# Altium footprint library 13-IC Packages-1bga.PcbLib: 97 footprints (part 14 of 14) (continued)
## FRES-MAPBGA-256 [mm] (continued)
  round 0.5 smd: T16(7.5,-7.5)
Top Overlay:
  circle w0.25: c-9.15,8.35 r0.125
  region: -7.5,8.5 -8.5,7.5 -8.5,8.5
  lines w0.2: -8.5,7.5 -7.5,8.5 ; -8.5,-8.5 8.5,-8.5 8.5,8.5 -8.5,8.5 -8.5,-8.5
Mechanical 13:
  lines w0.1: -8.5,-8.5 8.5,-8.5 8.5,8.5 -8.5,8.5 -8.5,-8.5
Mechanical 15:
  lines w0.05: -8.75,-8.75 8.75,-8.75 8.75,8.75 -8.75,8.75 -8.75,-8.75
  lines w0.1: -0.5,0 0.5,0 ; 0,-0.5 0,0.5

## K5D1G12ACC [mil]
height 157.48
pads (111):
  round 17 smd: A2(-204.72,-110.24) A9(-204.72,110.24) A10(-204.72,141.73) B1(-173.23,-141.73) B2(-173.23,-110.24) B3(-173.23,-78.74) B4(-173.23,-47.24) B5(-173.23,-15.74) B6(-173.23,15.75) B7(-173.23,47.24) B8(-173.23,78.74) B9(-173.23,110.24) B10(-173.23,141.73) C2(-141.73,-110.23) C3(-141.73,-78.74) C4(-141.73,-47.24) C5(-141.73,-15.75) C6(-141.73,15.75) C7(-141.73,47.24) C8(-141.73,78.74) C9(-141.73,110.24) D2(-110.24,-110.24) D3(-110.24,-78.74) D4(-110.24,-47.24) D5(-110.24,-15.75) D6(-110.24,15.75) D7(-110.24,47.24) D8(-110.24,78.74) D9(-110.24,110.24) E2(-78.74,-110.23) E3(-78.74,-78.74) E4(-78.74,-47.24) E5(-78.74,-15.75) E6(-78.74,15.75) E7(-78.74,47.24) E8(-78.74,78.74) E9(-78.74,110.24) F2(-47.24,-110.24) F3(-47.24,-78.74) F4(-47.24,-47.24) F5(-47.24,-15.75) F6(-47.24,15.75) F7(-47.24,47.24) F8(-47.24,78.74) F9(-47.24,110.24) G2(-15.75,-110.23) G3(-15.75,-78.74) G4(-15.75,-47.24) G5(-15.75,-15.75) G6(-15.75,15.75) G7(-15.75,47.24) G8(-15.75,78.74) G9(-15.75,110.24) H3(15.75,-78.74) H4(15.75,-47.24) H5(15.75,-15.75) H6(15.75,15.75) H7(15.75,47.24) H8(15.75,78.74) H9(15.75,110.24) J2(15.75,-110.24) J3(47.24,-78.74) J4(47.24,-47.24) J5(47.24,-15.75) J6(47.24,15.75) J7(47.24,47.24) J8(47.24,78.74) J9(47.24,110.24) K2(47.24,-110.23) K2(78.74,-110.24) K3(78.74,-78.74) K4(78.74,-47.24) K5(78.74,-15.75) K6(78.74,15.75) K7(78.74,47.24) K8(78.74,78.74) K9(78.74,110.24) L2(110.24,-110.23) L3(110.24,-78.74) L4(110.24,-47.24) L5(110.24,-15.75) L6(110.24,15.75) L7(110.24,47.24) L8(110.24,78.74) L9(110.24,110.24) M2(141.73,-110.24) M3(141.73,-78.74) M4(141.73,-47.24) M5(141.73,-15.75) M6(141.73,15.75) M7(141.73,47.24) M8(141.73,78.74) M9(141.73,110.24) N1(173.23,-141.73) N2(173.23,-110.24) N3(173.23,-78.74) N4(173.23,-47.24) N5(173.23,-15.74) N6(173.23,15.75) N7(173.23,47.24) N8(173.23,78.74) N9(173.23,110.24) N10(173.23,141.73) P1(204.72,-141.73) P2(204.72,-110.24) P9(204.72,110.24) P10(204.72,141.73)
  rect 7x38.5 smd: ""(-261.42,-196.46) ""(261.02,196.06)
  rect 38.5x7 smd: ""(-242.91,-212.2) ""(242.52,211.81)
Top Overlay:
  circle w1: c-202.55,-164.17 r12
  lines w1: -255.91,-206.69 -255.91,206.69 255.91,206.69 255.91,-206.69 -255.91,-206.69

## K5D1258DCM [mil]
height 157.48
pads (137):
  round 15 smd mask+2: A2(-220.47,-110.24) A9(-220.47,110.24) A10(-220.47,141.73) B1(-188.98,-141.73) B2(-188.98,-110.24) B3(-188.98,-78.74) B4(-188.98,-47.24) B5(-188.98,-15.75) B6(-188.98,15.75) B7(-188.98,47.24) B8(-188.98,78.74) B10(-188.98,141.73) C2(-157.48,-110.24) C3(-157.48,-78.74) C4(-157.48,-47.24) C6(-157.48,15.75) C7(-157.48,47.24) C8(-157.48,78.74) C9(-157.48,110.24) D1(-125.98,-141.73) D2(-125.98,-110.24) D3(-125.98,-78.74) D4(-125.98,-47.24) D5(-125.98,-15.75) D6(-125.98,15.75) D7(-125.98,47.24) D8(-125.98,78.74) D10(-125.98,141.73) E1(-94.49,-141.73) E2(-94.49,-110.24) E3(-94.49,-78.74) E4(-94.49,-47.24) E5(-94.49,-15.75) E6(-94.49,15.75) E7(-94.49,47.24) E8(-94.49,78.74) E9(-94.49,110.24) F1(-62.99,-141.73) F2(-62.99,-110.24) F3(-62.99,-78.74) F4(-62.99,-47.24) F5(-62.99,-15.75) F6(-62.99,15.75) F7(-62.99,47.24) F8(-62.99,78.74) F10(-62.99,141.73) G1(-31.5,-141.73) G2(-31.5,-110.24) G3(-31.5,-78.74) G4(-31.5,-47.24) G5(-31.5,-15.75) G6(-31.5,15.75) G7(-31.5,47.24) G8(-31.5,78.74) G9(-31.5,110.24) H1(0,-141.73) H2(0,-110.24) H3(0,-78.74) H4(0,-47.24) H5(0,-15.75) H6(0,15.75) H7(0,47.24) H8(0,78.74) H10(0,141.73) J2(31.5,-110.24) J3(31.5,-78.74) J4(31.5,-47.24) J5(31.5,-15.75) J6(31.5,15.75) J7(31.5,47.24) J8(31.5,78.74) J10(31.5,141.73) K1(62.99,-141.73) K2(62.99,-110.24) K3(62.99,-78.74) K4(62.99,-47.24) K5(62.99,-15.75) K6(62.99,15.75) K7(62.99,47.24) K8(62.99,78.74) K9(62.99,110.24) L1(94.49,-141.73) L2(94.49,-110.24) L3(94.49,-78.74) L4(94.49,-47.24) L5(94.49,-15.75) L6(94.49,15.75) L7(94.49,47.24) L8(94.49,78.74) L9(94.49,110.24) M1(125.98,-141.73) M3(125.98,-78.74) M4(125.98,-47.24) M5(125.98,-15.75) M6(125.98,15.75) M7(125.98,47.24) M8(125.98,78.74) M10(125.98,141.73) N1(157.48,-141.73) N2(157.48,-110.24) N3(157.48,-78.74) N4(157.48,-47.24) N5(157.48,-15.75) N6(157.48,15.75) N7(157.48,47.24) N8(157.48,78.74) N9(157.48,110.24) P1(188.98,-141.73) P2(188.98,-110.24) P3(188.98,-78.74) P4(188.98,-47.24) P5(188.98,-15.75) P7(188.98,47.24) P8(188.98,78.74) P10(188.98,141.73) R1(220.47,-141.73) R2(220.47,-110.24) R9(220.47,110.24) R10(220.47,141.73)
  round 15 smd mask+0: B9(-188.98,110.24) C1(-157.48,-141.73) C5(-157.48,-15.75) C10(-157.48,141.73) D9(-125.98,110.24) E10(-94.49,141.73) F9(-62.99,110.24) G10(-31.5,141.73) H9(0,110.24) J1(31.5,-141.73) J9(31.5,110.24) K10(62.99,141.73) L10(94.49,141.73) M2(125.98,-110.24) M9(125.98,110.24) N10(157.48,141.73) P6(188.98,15.75) P9(188.98,110.24)
Top Overlay:
  circle w1: c-216,-169.5 r12
  lines w1: -256.23,-206.69 256.22,-206.69 ; -256.23,-206.69 -256.23,206.69 ; -256.23,-206.69 -275.59,-206.69 -275.59,206.69 -256.23,206.69 ; -256.23,206.69 256.22,206.69 ; 256.22,-206.69 256.22,206.69 ; 256.22,-206.69 275.58,-206.69 ; 256.22,206.69 275.58,206.69 275.59,-206.68 ; 275.58,-206.69 275.59,-206.68
3D body "k5d1258dcm.stp": height 26.77, standoff 0, extent -255.91,-208.66 255.91,204.72

## K9F1208 [mil]
height 157.48
pads (63):
  round 18 smd mask+2: A1(-110.24,-78.74) A2(-110.24,-47.24) A3(-110.24,-15.75) A4(-110.24,15.75) A5(-110.24,47.24) A6(-110.24,79.27) B1(-78.74,-78.74) B2(-78.74,-47.24) B3(-78.74,-15.75) B4(-78.74,15.75) B5(-78.74,47.24) B6(-78.74,79.27) C1(-47.24,-78.74) C2(-47.24,-47.24) C3(-47.24,-15.75) C4(-47.24,15.75) C5(-47.24,47.24) C6(-47.24,79.27) D1(-15.75,-78.74) D2(-15.75,-47.24) D3(-15.75,-15.75) D4(-15.75,15.75) D5(-15.75,47.24) D6(-15.75,79.27) E1(15.75,-78.74) E2(15.75,-47.24) E3(15.75,-15.75) E4(15.75,15.75) E5(15.75,47.24) E6(15.75,80.27) F1(47.24,-78.74) F2(47.24,-47.24) F3(47.24,-15.75) F4(47.24,15.75) F5(47.24,47.24) F6(47.24,80.27) G1(78.74,-78.74) G2(78.74,-47.24) G3(78.74,-15.75) G4(78.74,15.75) G5(78.74,47.24) G6(78.74,80.27) H1(110.24,-78.74) H2(110.24,-47.24) H3(110.24,-15.75) H4(110.24,15.75) H5(110.24,47.24) H6(110.24,80.27) ""(-173.23,-141.73) ""(-173.23,-110.24) ""(-173.23,110.24) ""(-173.23,141.73) ""(-141.73,-141.73) ""(-141.73,110.24) ""(-141.73,141.73) ""(141.73,-141.73) ""(141.73,-110.24) ""(141.73,110.24) ""(141.73,141.73) ""(173.23,-141.73) ""(173.23,-110.24) ""(173.23,110.24) ""(173.23,141.73)
Top Overlay:
  circle w1: c-157.5,-125.5 r13.2
  lines w1: -256,-167.32 -256,167.32 -216.81,167.32 217.05,167.32 256,167.32 256,-167.32 217.05,-167.32 -216.81,-167.32 -256,-167.32 ; -216.81,-177.17 -216.81,177.17 217.05,177.17 217.05,-177.17 -216.81,-177.17
Top Solder:
  region: 257,-138.32 257,-168.32 227,-168.32 227,-173.32 262,-173.32 262,-138.32
  region: 218.05,-148.17 218.05,-178.17 188.05,-178.17 188.05,-183.17 223.05,-183.17 223.05,-148.17
  region: 227,168.32 257,168.32 257,138.32 262,138.32 262,173.32 227,173.32
  region: 188.05,178.17 218.05,178.17 218.05,148.17 223.05,148.17 223.05,183.17 188.05,183.17
  region: -257,138.32 -257,168.32 -227,168.32 -227,173.32 -262,173.32 -262,138.32
  region: -217.81,148.17 -217.81,178.17 -187.81,178.17 -187.81,183.17 -222.81,183.17 -222.81,148.17
  region: -227,-168.32 -257,-168.32 -257,-138.32 -262,-138.32 -262,-173.32 -227,-173.32
  region: -187.81,-178.17 -217.81,-178.17 -217.81,-148.17 -222.81,-148.17 -222.81,-183.17 -187.81,-183.17

## K9F5608 [mil]
height 157.48
pads (63):
  round 18 smd mask+2: A1(-110.24,-78.74) A2(-110.24,-47.24) A3(-110.24,-15.75) A4(-110.24,15.75) A5(-110.24,47.24) A6(-110.24,79.27) B1(-78.74,-78.74) B2(-78.74,-47.24) B3(-78.74,-15.75) B4(-78.74,15.75) B5(-78.74,47.24) B6(-78.74,79.27) C1(-47.24,-78.74) C2(-47.24,-47.24) C3(-47.24,-15.75) C4(-47.24,15.75) C5(-47.24,47.24) C6(-47.24,79.27) D1(-15.75,-78.74) D2(-15.75,-47.24) D3(-15.75,-15.75) D4(-15.75,15.75) D5(-15.75,47.24) D6(-15.75,79.27) E1(15.75,-78.74) E2(15.75,-47.24) E3(15.75,-15.75) E4(15.75,15.75) E5(15.75,47.24) E6(15.75,80.27) F1(47.24,-78.74) F2(47.24,-47.24) F3(47.24,-15.75) F4(47.24,15.75) F5(47.24,47.24) F6(47.24,80.27) G1(78.74,-78.74) G2(78.74,-47.24) G3(78.74,-15.75) G4(78.74,15.75) G5(78.74,47.24) G6(78.74,80.27) H1(110.24,-78.74) H2(110.24,-47.24) H3(110.24,-15.75) H4(110.24,15.75) H5(110.24,47.24) H6(110.24,80.27) ""(-173.23,-141.73) ""(-173.23,-110.24) ""(-173.23,110.24) ""(-173.23,141.73) ""(-141.73,-141.73) ""(-141.73,110.24) ""(-141.73,141.73) ""(141.73,-141.73) ""(141.73,-110.24) ""(141.73,110.24) ""(141.73,141.73) ""(173.23,-141.73) ""(173.23,-110.24) ""(173.23,110.24) ""(173.23,141.73)
Top Overlay:
  circle w1: c-157.5,-125.5 r13.2
  lines w1: -216.81,-177.17 -216.81,177.17 217.05,177.17 217.05,-177.17 -216.81,-177.17
Top Solder:
  region: 218.05,-148.17 218.05,-178.17 188.05,-178.17 188.05,-183.17 223.05,-183.17 223.05,-148.17
  region: 188.05,178.17 218.05,178.17 218.05,148.17 223.05,148.17 223.05,183.17 188.05,183.17
  region: -217.81,148.17 -217.81,178.17 -187.81,178.17 -187.81,183.17 -222.81,183.17 -222.81,148.17
  region: -187.81,-178.17 -217.81,-178.17 -217.81,-148.17 -222.81,-148.17 -222.81,-183.17 -187.81,-183.17

## LTM8033 [mm]
height 1.6
pads (76):
  round 0.635 smd mask+0.07: A1/out(-6.35,-4.445)
  rect 0.635x0.635 smd mask+0.07: A2/out(-6.35,-3.175) A3/out(-6.35,-1.905) A4/gnd(-6.35,-0.635) A5/gnd(-6.35,0.635) A6/share(-6.35,1.905) A7/adj(-6.35,3.175) A8/gnd(-6.35,4.445) B1/out(-5.08,-4.445) B2/out(-5.08,-3.175) B3/out(-5.08,-1.905) B4/gnd(-5.08,-0.635) B5/gnd(-5.08,0.635) B6/rt(-5.08,1.905) B7/pgood(-5.08,3.175) B8/sync(-5.08,4.445) C1/out(-3.81,-4.445) C2/out(-3.81,-3.175) C3/out(-3.81,-1.905) C4/gnd(-3.81,-0.635) C5/gnd(-3.81,0.635) C6/gnd(-3.81,1.905) C7/gnd(-3.81,3.175) C8/gnd(-3.81,4.445) D1/out(-2.54,-4.445) D2/out(-2.54,-3.175) D3/out(-2.54,-1.905) D4/gnd(-2.54,-0.635) D5/gnd(-2.54,0.635) D6/gnd(-2.54,1.905) D7/gnd(-2.54,3.175) D8/gnd(-2.54,4.445) E1/gnd(-1.27,-4.445) E2/gnd(-1.27,-3.175) E3/gnd(-1.27,-1.905) E4/gnd(-1.27,-0.635) E5/gnd(-1.27,0.635) E6/gnd(-1.27,1.905) E7/gnd(-1.27,3.175) E8/gnd(-1.27,4.445) F1/gnd(0,-4.445) F2/gnd(0,-3.175) F3/gnd(0,-1.905) F4/gnd(0,-0.635) F5/gnd(0,0.635) F6/gnd(0,1.905) F6/gnd(0,3.175) F8/gnd(0,4.445) G1/gnd(1.27,-4.445) G2/gnd(1.27,-3.175) G3/aux(1.27,-1.905) G4/bias(1.27,-0.635) G5/gnd(1.27,0.635) G6/gnd(1.27,1.905) G7/gnd(1.27,3.175) G8/run(1.27,4.445) H5/gnd(2.54,0.635) H6/gnd(2.54,1.905) J1/in(3.81,-4.445) J2/in(3.81,-3.175) J3/in(3.81,-1.905) J5/gnd(3.81,0.635) J6/gnd(3.81,1.905) J8/fin(3.81,4.445) K1/in(5.08,-4.445) K2/in(5.08,-3.175) K3/in(5.08,-1.905) K5/gnd(5.08,0.635) K6/gnd(5.08,1.905) K8/fin(5.08,4.445) L2/in(6.35,-3.175) L3/in(6.35,-1.905) L5/gnd(6.35,0.635) L6/gnd(6.35,1.905) L8/fin(6.35,4.445)
  rect 0.635x0.635 smd: L1/in(6.35,-4.445)
Top Overlay:
  lines w0.254: -7.645,-5.766 7.645,-5.766 7.645,5.766 -7.645,5.766 -7.645,-5.766
Mechanical 15:
  lines w0.1: -7.5,-5.625 -7.5,5.625 7.5,5.625 7.5,-5.625 -7.5,-5.625
3D body "ltm8033.stp": height 4.93, standoff 0, extent -7.5,-5.625 7.5,5.625

## LTM-2881 [mm]
height 1.6
pads (32):
  round 0.65 smd mask+0.07: "A1 / Dout"(-6.35,-4.445) "A2 / TE"(-6.35,-3.175) "A3 / DI"(-6.35,-1.905) "A4 / DE"(-6.35,-0.635) "A5 / DE-"(-6.35,0.635) "A6 / RO"(-6.35,1.905) "A7 / VL"(-6.35,3.175) B1(-5.08,-4.445) B2(-5.08,-3.175) B3(-5.08,-1.905) "B4 / GND"(-5.08,-0.635) B5(-5.08,0.635) B6(-5.08,1.905) "B7 / Vcc"(-5.08,3.175) B8(-5.08,4.445) K1(5.08,-4.445) K2(5.08,-3.175) K3(5.08,-1.905) K4(5.08,-0.635) "K5 / GND2"(5.08,0.635) K6(5.08,1.905) K7(5.08,3.175) K8(5.08,4.445) "L1 / Din"(6.35,-4.445) "L2 / SLO-"(6.35,-3.175) "L3 / Y"(6.35,-1.905) "L4 / Z"(6.35,-0.635) "L5 / B"(6.35,0.635) "L6 / A"(6.35,1.905) "L7 / Vcc2"(6.35,3.175) L8(6.35,4.445)
  round 0.65 smd: "A8 / ON"(-6.35,4.445)
Top Overlay:
  lines w0.1: -0.318,0 0.318,0 ; 0,-0.318 0,0.318
  lines w0.254: -7.48,-4.966 -6.782,-5.664 ; -7.5,-5.675 7.5,-5.675 7.5,5.675 -7.5,5.675 -7.5,-5.675
3D body "ltm2881.stp": height 3.65, standoff -0.03, extent -7.5,-5.75 7.5,5.75

## MTGP720H320V6P [mm]
pads (1):
  round 7.2 hole 3.25: 1(0,0)
via -2.2,-1.35 diameter 1 hole 0.5
via -2.2,1.375 diameter 1 hole 0.5
via 0,2.525 diameter 1 hole 0.5
via 2.2,1.35 diameter 1 hole 0.5
via 0,-2.625 diameter 1 hole 0.5
via 2.2,-1.35 diameter 1 hole 0.5
Mechanical 8:
  circle w0.1: c0,0 r2.6
  circle w0.1: c0,0 r3.75
  lines w0.1: -2.657,1.625 -2.224,1.375 ; -2.632,-1.6 -2.199,-1.35 ; -2.474,0.942 -2.224,1.375 ; -2.449,-0.917 -2.199,-1.35 ; -1.974,1.808 -2.224,1.375 ; -1.949,-1.783 -2.199,-1.35 ; -1.791,1.125 -2.224,1.375 ; -1.766,-1.1 -2.199,-1.35 ; -0.5,-2.625 0,-2.625 ; -0.5,0 0,0 ; -0.5,2.525 0,2.525 ; 0,-3.125 0,-2.625 ; 0,-2.125 0,-2.625 ; 0,-0.5 0,0 ; 0,0.5 0,0 ; 0,2.025 0,2.525 ; 0,3.025 0,2.525 ; 0.5,-2.625 0,-2.625 ; 0.5,0 0,0 ; 0.5,2.525 0,2.525 ; 1.766,-1.1 2.199,-1.35 ; 1.766,1.1 2.199,1.35 ; 1.949,-1.783 2.199,-1.35 ; 1.949,1.783 2.199,1.35 ; 2.449,-0.917 2.199,-1.35 ; 2.449,0.917 2.199,1.35 ; 2.632,-1.6 2.199,-1.35 ; 2.632,1.6 2.199,1.35
Mechanical 14:
  circle w0.1: c0,0 r3.75
Mechanical 15:
  circle w0.05: c0,0 r3.85
3D body "mtgp720h320v6p.stp": height 0.1, standoff -1.75, extent -3.627,-3.627 3.628,3.628

## NAND99R4M2AZBA5 [mil]
height 62.99
pads (153):
  round 16.5 smd: A1(236.22,173.23) A2(236.22,141.73) A10(236.22,-110.24) A11(236.22,-141.73) A12(236.22,-173.23) B1(204.72,173.23) B2(204.72,141.73) B3(204.72,110.5) B10(204.72,-110.24) B11(204.72,-141.73) B12(204.72,-173.23) C1(173.23,173.23) C2(173.23,141.73) C3(173.23,110.24) C4(173.23,78.74) C5(173.23,47.24) C6(173.23,15.75) C7(173.23,-15.75) C8(173.23,-47.24) C9(173.23,-78.74) C10(173.23,-110.24) C11(173.23,-141.73) C12(173.23,-173.23) D1(139.73,173.23) D2(140.73,141.73) D3(141.73,110.24) D4(141.73,78.74) D5(141.73,47.24) D6(141.73,15.75) D7(141.73,-15.75) D8(141.73,-47.24) D9(141.73,-78.74) D10(141.73,-110.24) D11(141.73,-141.73) E2(109.24,141.73) E3(110.24,110.24) E4(110.24,78.74) E5(110.24,47.24) E6(110.24,15.75) E7(110.24,-15.75) E8(110.24,-47.24) E9(110.24,-78.74) E10(110.24,-110.24) E11(110.24,-141.73) F2(77.74,141.73) F3(78.74,110.24) F4(78.74,78.74) F5(78.74,47.24) F6(78.74,15.75) F7(78.74,-15.75) F8(78.74,-47.24) F9(78.74,-78.74) F10(78.74,-110.24) F11(78.74,-141.73) G2(46.24,141.73) G3(47.24,110.24) G4(47.24,78.74) G5(47.24,47.24) G6(47.24,15.75) G7(47.24,-15.75) G8(47.24,-47.24) G9(47.24,-78.74) G10(47.24,-110.24) G11(47.24,-141.73) H2(14.75,141.73) H3(15.75,110.24) H4(15.75,78.74) H5(15.75,47.24) H6(15.75,15.75) H7(15.75,-15.75) H8(15.75,-47.24) H9(15.75,-78.74) H10(15.75,-110.24) H11(15.75,-141.73) J2(-16.75,141.73) J3(-15.75,110.24) J4(-15.75,78.74) J5(-15.75,47.24) J6(-15.75,15.75) J7(-15.75,-15.75) J8(-15.75,-47.24) J9(-15.75,-78.74) J10(-15.75,-110.24) J11(-15.75,-141.73) K2(-48.24,141.73) K3(-47.24,110.24) K4(-47.24,78.74) K5(-47.24,47.24) K6(-47.24,15.75) K7(-47.24,-15.75) K8(-47.24,-47.24) K9(-47.24,-78.74) K10(-47.24,-110.24) K11(-47.24,-141.73) L2(-79.74,141.73) L3(-78.74,110.24) L4(-78.74,78.74) L5(-78.74,47.24) L6(-78.74,15.75) L7(-78.74,-15.75) L8(-78.74,-47.24) L9(-78.74,-78.74) L10(-78.74,-110.24) L11(-78.74,-141.73) M2(-111.24,141.73) M3(-110.24,110.24) M4(-110.24,78.74) M5(-110.24,47.24) M6(-110.24,15.75) M7(-110.24,-15.75) M8(-110.24,-47.24) M9(-110.24,-78.74) M10(-110.24,-110.24) M11(-110.24,-141.73) N2(-142.73,141.73) N2(236.22,110.24) N3(-141.73,110.24) N4(-141.73,78.74) N5(-141.73,47.24) N6(-141.73,15.75) N7(-141.73,-15.75) N8(-141.73,-47.24) N9(-141.73,-78.74) N10(-141.73,-110.24) N11(-141.73,-141.73) P1(-173.23,173.23) P2(-173.23,141.73) P3(-173.23,110.24) P4(-173.23,78.74) P5(-173.23,47.24) P6(-173.23,15.75) P7(-173.23,-15.75) P8(-173.23,-47.24) P9(-173.23,-78.74) P10(-173.23,-110.24) P11(-173.23,-141.73) P12(-173.23,-173.23) R1(-204.72,173.23) R2(-204.72,141.73) R3(-204.72,110.5) R10(-204.72,-110.24) R11(-204.72,-141.73) R12(-204.72,-173.23) T1(-236.22,173.23) T2(-236.22,141.73) T3(-236.22,110.5) T10(-236.22,-110.24) T11(-236.22,-141.73) T12(-236.22,-173.23)
  rect 7x38.5 smd: ""(-273,-192) ""(273,192)
  rect 38.5x7 smd: ""(-257,-208) ""(257,208)
Top Overlay:
  circle w1: c202.55,164.17 r12
  lines w3: -265,-200 265,-200 265,200 -265,200 -265,-200

## PB [mm]
Top Overlay:
  circle w0.5: c-0.031,0.013 r2.5
  lines w0.5: -1.737,1.719 1.675,-1.693
  text "Pb" at -1.536,-0.948 h3.05
3D body "pb.stp": height 0.02, standoff 0, extent -2.725,-2.725 2.725,2.725

## RT5350F [mm]
height 1.6
pads (196):
  round 0.406 smd mask+0: A1(-5.2,-5.2) A4(-5.2,-2.8) B2(-4.4,-4.4) B4(-4.4,-2.8) C2(-3.6,-4.4) C3(-3.6,-3.6) C4(-3.6,-2.8) C5(-3.6,-2) D2(-2.8,-4.4) D3(-2.8,-3.6) D4(-2.8,-2.8) D5(-2.8,-2) D6(-2.8,-1.2) D7(-2.8,-0.4) D8(-2.8,0.4) D9(-2.8,1.2) E2(-2,-4.4) E4(-2,-2.8) E5(-2,-2) E6(-2,-1.2) E7(-2,-0.4) E8(-2,0.4) E9(-2,1.2) F1(-1.2,-5.2) F2(-1.2,-4.4) F3(-1.2,-3.6) F4(-1.2,-2.8) F6(-1.2,-1.2) F7(-1.2,-0.4) F8(-1.2,0.4) G6(-0.4,-1.2) G7(-0.4,-0.4) G8(-0.4,0.4) H6(0.4,-1.2) H7(0.4,-0.4) H8(0.4,0.4) J6(1.2,-1.2) J7(1.2,-0.4) J8(1.2,0.4) J9(1.2,1.2) K9(2,1.2) K10(2,2) L10(2.8,2) M10(3.6,2) M11(3.6,2.8) M12(3.6,3.6) N10(4.4,2) N13(4.4,4.4) N14(4.4,5.2) P10(5.2,2) P14(5.2,5.2)
  round 0.406 smd: A2(-5.2,-4.4) A3(-5.2,-3.6) A5(-5.2,-2) A6(-5.2,-1.2) A7(-5.2,-0.4) A8(-5.2,0.4) A9(-5.2,1.2) A10(-5.2,2) A11(-5.2,2.8) A12(-5.2,3.6) A13(-5.2,4.4) A14(-5.2,5.2) B1(-4.4,-5.2) B3(-4.4,-3.6) B5(-4.4,-2) B6(-4.4,-1.2) B7(-4.4,-0.4) B8(-4.4,0.4) B9(-4.4,1.2) B10(-4.4,2) B11(-4.4,2.8) B12(-4.4,3.6) B13(-4.4,4.4) B14(-4.4,5.2) C1(-3.6,-5.2) C6(-3.6,-1.2) C7(-3.6,-0.4) C8(-3.6,0.4) C9(-3.6,1.2) C10(-3.6,2) C11(-3.6,2.8) C12(-3.6,3.6) C13(-3.6,4.4) C14(-3.6,5.2) D1(-2.8,-5.2) D10(-2.8,2) D11(-2.8,2.8) D12(-2.8,3.6) D13(-2.8,4.4) D14(-2.8,5.2) E1(-2,-5.2) E3(-2,-3.6) E10(-2,2) E11(-2,2.8) E12(-2,3.6) E13(-2,4.4) E14(-2,5.2) F5(-1.2,-2) F9(-1.2,1.2) F10(-1.2,2) F11(-1.2,2.8) F12(-1.2,3.6) F13(-1.2,4.4) F14(-1.2,5.2) G1(-0.4,-5.2) G2(-0.4,-4.4) G3(-0.4,-3.6) G4(-0.4,-2.8) G5(-0.4,-2) G9(-0.4,1.2) G10(-0.4,2) G11(-0.4,2.8) G12(-0.4,3.6) G13(-0.4,4.4) G14(-0.4,5.2) H1(0.4,-5.2) H2(0.4,-4.4) H3(0.4,-3.6) H4(0.4,-2.8) H5(0.4,-2) H9(0.4,1.2) H10(0.4,2) H11(0.4,2.8) H12(0.4,3.6) H13(0.4,4.4) H14(0.4,5.2) J1(1.2,-5.2) J2(1.2,-4.4) J3(1.2,-3.6) J4(1.2,-2.8) J5(1.2,-2) J10(1.2,2) J11(1.2,2.8) J12(1.2,3.6) J13(1.2,4.4) J14(1.2,5.2) K1(2,-5.2) K2(2,-4.4) K3(2,-3.6) K4(2,-2.8) K5(2,-2) K6(2,-1.2) K7(2,-0.4) K8(2,0.4) K11(2,2.8) K12(2,3.6) K13(2,4.4) K14(2,5.2) L1(2.8,-5.2) L2(2.8,-4.4) L3(2.8,-3.6) L4(2.8,-2.8) L5(2.8,-2) L6(2.8,-1.2) L7(2.8,-0.4) L8(2.8,0.4) L9(2.8,1.2) L11(2.8,2.8) L12(2.8,3.6) L13(2.8,4.4) L14(2.8,5.2) M1(3.6,-5.2) M2(3.6,-4.4) M3(3.6,-3.6) M4(3.6,-2.8) M5(3.6,-2) M6(3.6,-1.2) M7(3.6,-0.4) M8(3.6,0.4) M9(3.6,1.2) M13(3.6,4.4) M14(3.6,5.2) N1(4.4,-5.2) N2(4.4,-4.4) N3(4.4,-3.6) N4(4.4,-2.8) N5(4.4,-2) N6(4.4,-1.2) N7(4.4,-0.4) N8(4.4,0.4) N9(4.4,1.2) N11(4.4,2.8) N12(4.4,3.6) P1(5.2,-5.2) P2(5.2,-4.4) P3(5.2,-3.6) P4(5.2,-2.8) P5(5.2,-2) P6(5.2,-1.2) P7(5.2,-0.4) P8(5.2,0.4) P9(5.2,1.2) P11(5.2,2.8) P12(5.2,3.6) P13(5.2,4.4)
Top Overlay:
  lines w0.254: -6.178,-5.213 -5.187,-6.203 -4.984,-6.203 ; -6.051,-5.556 -5.479,-6.127 -5.708,-6.127 -6.185,-5.65 -6.185,-5.841 -5.822,-6.203 ; -6.198,-6.203 -5.975,-6.203 6.179,-6.203 6.179,6.198 -6.198,6.198 -6.198,-6.203
3D body "rt5350f.stp": height 1.03, standoff 0, extent -6.006,-6 5.994,6

## TP [mm]
height 11.7
pads (1):
  round 2 smd mask+1: W(0,0)
Top Overlay:
  circle w0.254: c0,0 r2.195
Keep-Out Layer:
  circle w0.025: c0,0 r2.017
3D body "1_016-1_016-3_tp.stp": height 0.02, standoff 0, extent -1.5,-1.5 1.5,1.5